# Altium footprint library 9-Pcblib_Con.PcbLib: 266 footprints (part 6 of 17)
Each footprint in its own frame and in the unit in brackets; x right, y up, seen from the top. Pads: shape width x height; smd on the part's side, far side on the other; paste and mask are expansions set on the pad; w line width, h text height; cw(c..) or ccw(c..) is an arc to the next point about the centre after c.
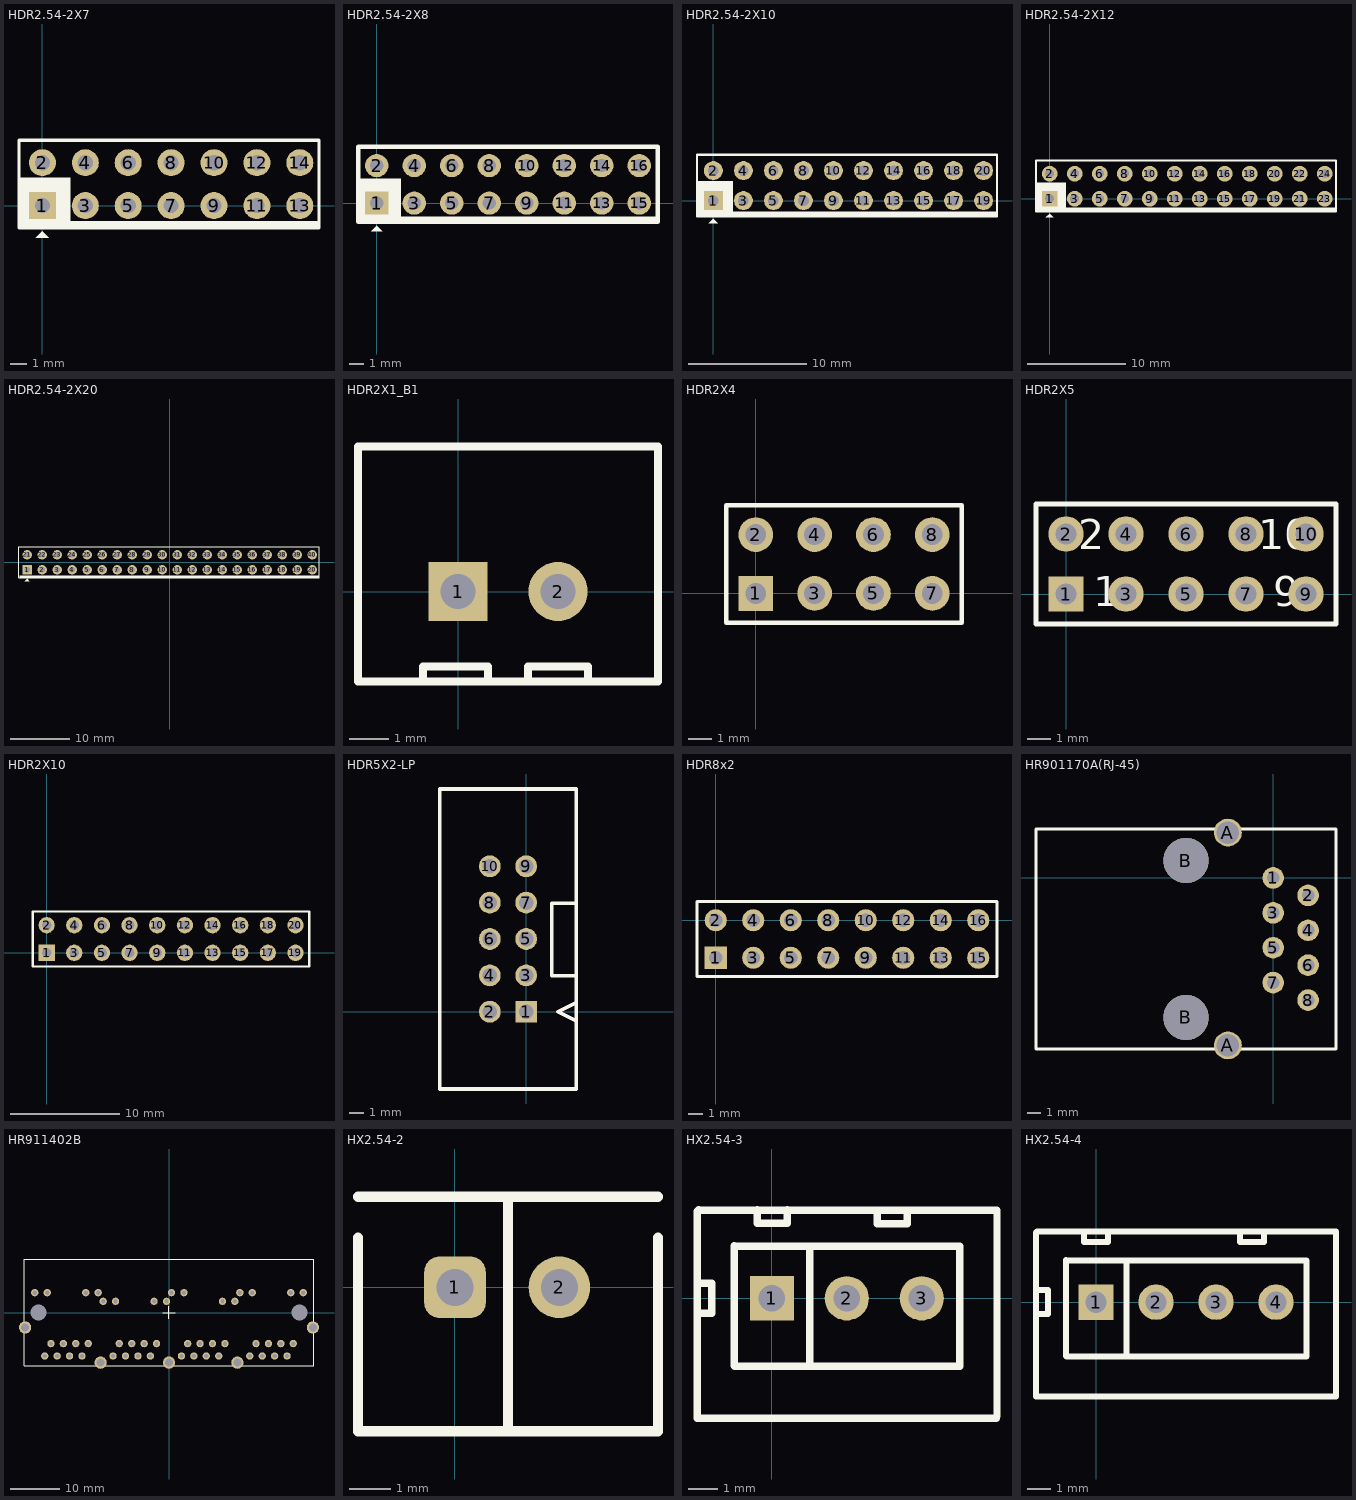
[diagram p5: the footprints below, top view; thin cyan lines are the x and y axes]

## HDR2.54-2X7 [mm]
pads (14):
  rect 1.6x1.6 hole 0.9: 1(0,0)
  round 1.6 hole 0.9: 2(0,2.54) 3(2.54,0) 4(2.54,2.54) 5(5.08,0) 6(5.08,2.54) 7(7.62,0) 8(7.62,2.54) 9(10.16,0) 10(10.16,2.54) 11(12.7,0) 12(12.7,2.54) 13(15.24,0) 14(15.24,2.54)
Top Overlay:
  rectangle: -1.387,-1.328 1.651,1.651
  region: -0.381,-1.905 0.381,-1.905 0,-1.524
  lines w0.2: -1.387,-1.143 16.377,-1.143 ; -1.26,-1.016 16.377,-1.016
  lines w0.203: -1.387,-1.328 -1.387,3.868 16.377,3.868 16.377,-1.328 -1.387,-1.328

## HDR2.54-2X8 [mil]
pads (16):
  rect 62x62 hole 35.43: 1(0,0)
  round 62 hole 35.43: 2(0,100) 3(100,0) 4(100,100) 5(200,0) 6(200,100) 7(300,0) 8(300,100) 9(400,0) 10(400,100) 11(500,0) 12(500,100) 13(600,0) 14(600,100) 15(700,0) 16(700,100)
Top Overlay:
  rectangle: -50,-50 65,65
  region: -15,-75 15,-75 0,-60
  lines w7.87: -50,-40 750,-40
  lines w12: -50,50 50,50 50,-50 ; -50,-50 -50,150 750,150 750,-50 -50,-50

## HDR2.54-2X10 [mm]
pads (20):
  rect 1.6x1.6 hole 0.9: 1(0,0)
  round 1.6 hole 0.9: 2(0,2.54) 3(2.54,0) 4(2.54,2.54) 5(5.08,0) 6(5.08,2.54) 7(7.62,0) 8(7.62,2.54) 9(10.16,0) 10(10.16,2.54) 11(12.7,0) 12(12.7,2.54) 13(15.24,0) 14(15.24,2.54) 15(17.78,0) 16(17.78,2.54) 17(20.32,0) 18(20.32,2.54) 19(22.86,0) 20(22.86,2.54)
Top Overlay:
  rectangle: -1.387,-1.328 1.651,1.651
  region: -0.381,-1.905 0.381,-1.905 0,-1.524
  lines w0.2: -1.26,-1.143 23.997,-1.143 ; -1.26,-1.016 23.997,-1.016
  lines w0.203: -1.387,-1.328 23.997,-1.328 23.997,3.868 -1.387,3.868 -1.387,-1.328

## HDR2.54-2X12 [mm]
pads (24):
  rect 1.6x1.6 hole 0.9: 1(0,0)
  round 1.6 hole 0.9: 2(0,2.54) 3(2.54,0) 4(2.54,2.54) 5(5.08,0) 6(5.08,2.54) 7(7.62,0) 8(7.62,2.54) 9(10.16,0) 10(10.16,2.54) 11(12.7,0) 12(12.7,2.54) 13(15.24,0) 14(15.24,2.54) 15(17.78,0) 16(17.78,2.54) 17(20.32,0) 18(20.32,2.54) 19(22.86,0) 20(22.86,2.54) 21(25.4,0) 22(25.4,2.54) 23(27.94,0) 24(27.94,2.54)
Top Overlay:
  rectangle: -1.387,-1.328 1.651,1.651
  region: -0.381,-1.905 0.381,-1.905 0,-1.524
  lines w0.2: -1.26,-1.143 29.077,-1.143 ; -1.26,-1.016 29.077,-1.016
  lines w0.203: -1.387,-1.328 29.077,-1.328 29.077,3.868 -1.387,3.868 -1.387,-1.328

## HDR2.54-2X20 [mm]
pads (40):
  rect 1.6x1.6 hole 0.9: 1(-24.13,-1.27)
  round 1.6 hole 0.9: 2(-21.59,-1.27) 3(-19.05,-1.27) 4(-16.51,-1.27) 5(-13.97,-1.27) 6(-11.43,-1.27) 7(-8.89,-1.27) 8(-6.35,-1.27) 9(-3.81,-1.27) 10(-1.27,-1.27) 11(1.27,-1.27) 12(3.81,-1.27) 13(6.35,-1.27) 14(8.89,-1.27) 15(11.43,-1.27) 16(13.97,-1.27) 17(16.51,-1.27) 18(19.05,-1.27) 19(21.59,-1.27) 20(24.13,-1.27) 21(-24.13,1.27) 22(-21.59,1.27) 23(-19.05,1.27) 24(-16.51,1.27) 25(-13.97,1.27) 26(-11.43,1.27) 27(-8.89,1.27) 28(-6.35,1.27) 29(-3.81,1.27) 30(-1.27,1.27) 31(1.27,1.27) 32(3.81,1.27) 33(6.35,1.27) 34(8.89,1.27) 35(11.43,1.27) 36(13.97,1.27) 37(16.51,1.27) 38(19.05,1.27) 39(21.59,1.27) 40(24.13,1.27)
Top Overlay:
  region: -24.511,-3.175 -23.749,-3.175 -24.13,-2.794
  lines w0.2: -25.39,-2.413 25.267,-2.413 ; -25.39,-2.286 25.267,-2.286
  lines w0.203: -25.517,-2.598 25.267,-2.598 25.267,2.598 -25.517,2.598 -25.517,-2.598

## HDR2X1_B1 [mm] "Connector; Header; 4 Position"
height 1.6
pads (2):
  rect 1.5x1.5 hole 0.9: 1(0,0)
  round 1.5 hole 0.9: 2(2.54,0)
Top Overlay:
  lines w0.2: -0.889,-2.286 -0.889,-1.905 0.762,-1.905 0.762,-2.286 ; 1.778,-2.286 1.778,-1.905 3.302,-1.905 3.302,-2.286 ; -2.54,-2.286 -2.54,3.683 5.08,3.683 5.08,-2.286 -2.54,-2.286
3D body: height 1.5, standoff 0, extent -2.413,-2.159 5.08,3.556

## HDR2X4 [mm] "Connector; Header; 4x2 Position"
height 10.16
pads (8):
  rect 1.5x1.5 hole 0.9: 1(0,0)
  round 1.5 hole 0.9: 2(0,2.54) 3(2.54,0) 4(2.54,2.54) 5(5.08,0) 6(5.08,2.54) 7(7.62,0) 8(7.62,2.54)
Top Overlay:
  lines w0.2: -1.27,-1.27 8.89,-1.27 8.89,3.81 -1.27,3.81 -1.27,-1.27

## HDR2X5 [mm] "Connector; Header; 5x2 Position"
pads (10):
  rect 1.5x1.5 hole 0.9: 1(0,0)
  round 1.5 hole 0.9: 2(0,2.54) 3(2.54,0) 4(2.54,2.54) 5(5.08,0) 6(5.08,2.54) 7(7.62,0) 8(7.62,2.54) 9(10.16,0) 10(10.16,2.54)
Top Overlay:
  lines w0.2: -1.27,-1.27 11.43,-1.27 11.43,3.81 -1.27,3.81 -1.27,-1.27
  text "10" at 8.128,1.905 h1.27
  text "9" at 8.763,-0.508 h1.27
  text "1" at 1.143,-0.508 h1.27
  text "2" at 0.508,1.905 h1.27

## HDR2X10 [mm] "Connector; Header; 10x2 Position"
height 1.1
pads (20):
  rect 1.5x1.5 hole 0.9: 1(0,0)
  round 1.5 hole 0.9: 2(0,2.54) 3(2.54,0) 4(2.54,2.54) 5(5.08,0) 6(5.08,2.54) 7(7.62,0) 8(7.62,2.54) 9(10.16,0) 10(10.16,2.54) 11(12.7,0) 12(12.7,2.54) 13(15.24,0) 14(15.24,2.54) 15(17.78,0) 16(17.78,2.54) 17(20.32,0) 18(20.32,2.54) 19(22.86,0) 20(22.86,2.54)
Top Overlay:
  lines w0.2: -1.27,-1.27 -1.27,3.81 0.635,3.81 24.13,3.81 24.13,-1.27 0.635,-1.27 -1.27,-1.27

## HDR5X2-LP [mil]
pads (10):
  rect 60x60 hole 40: 1(0,0)
  round 60 hole 40: 2(-100,0) 3(0,100) 4(-100,100) 5(0,200) 6(-100,200) 7(0,300) 8(-100,300) 9(0,400) 10(-100,400)
Top Overlay:
  lines w10: 137.5,-25 87.5,0 137.5,25 ; 137.5,99.37 70.04,99.37 70.04,298.7 137.5,298.7 ; -237.5,-212.5 137.5,-212.5 137.5,612.5 -237.5,612.5 -237.5,-212.5

## HDR8x2 [mm]
pads (16):
  rect 1.5x1.5 hole 0.9: 1(0,-2.54)
  round 1.5 hole 0.9: 2(0,0) 3(2.54,-2.54) 4(2.54,0) 5(5.08,-2.54) 6(5.08,0) 7(7.62,-2.54) 8(7.62,0) 11(12.7,-2.54) 12(12.7,0)
  round 1.5 hole 0.9 mask+0.102: 9(10.16,-2.54) 10(10.16,0) 13(15.24,-2.54) 14(15.24,0) 15(17.78,-2.54) 16(17.78,0)
Top Overlay:
  lines w0.2: -1.27,-3.81 -1.27,1.27 19.05,1.27 19.05,-3.81 -1.27,-3.81
3D body: height 0.7, standoff -10.9, extent -1.27,-1.27 19.05,1.27
3D body: height 0.7, standoff -10.9, extent -1.27,-3.81 19.05,-1.27

## HR901170A(RJ-45) [mil]
pads (12):
  round 62 hole 36: 1(0,0) 2(100,-50) 3(0,-100) 4(100,-150) 5(0,-200) 6(100,-250) 7(0,-300) 8(100,-350)
  round 80 hole 65: A(-130,-480) A(-130,130)
  round 130 hole 130: B(-250,-400) B(-250,50)
Top Overlay:
  lines w8: -680,-490 180,-490 180,140 -680,140 -680,-490

## HR911402B [mm]
pads (55):
  round 1.5 hole 0.89: A1(25.397,-6.262) A2(24.127,-8.802) A3(22.857,-6.262) A4(21.587,-8.802) A5(20.317,-6.262) A6(19.047,-8.802) A7(17.777,-6.262) A8(16.507,-8.802) A9(27.427,4.148) A10(24.887,4.148) A11(17.017,4.148) A12(14.477,4.148) B1(11.427,-6.262) B2(10.157,-8.802) B3(8.887,-6.262) B4(7.617,-8.802) B5(6.347,-6.262) B6(5.077,-8.802) B7(3.807,-6.262) B8(2.537,-8.802) B9(13.457,2.378) B10(10.917,2.378) B11(3.047,4.148) B12(0.507,4.148) C1(-2.543,-6.262) C2(-3.813,-8.802) C3(-5.083,-6.262) C4(-6.353,-8.802) C5(-7.623,-6.262) C6(-8.893,-8.802) C7(-10.163,-6.262) C8(-11.433,-8.802) C9(-0.513,2.378) C10(-3.053,2.378) C11(-10.923,2.378) C12(-13.463,2.378) D1(-16.513,-6.262) D2(-17.783,-8.802) D3(-19.053,-6.262) D4(-20.323,-8.802) D5(-21.593,-6.262) D6(-22.863,-8.802) D7(-24.133,-6.262) D8(-25.403,-8.802) D9(-14.483,4.148) D10(-17.023,4.148) D11(-24.893,4.148) D12(-27.433,4.148)
  round 2.5 hole 1.63: ""(-29.408,-2.962) ""(-13.973,-10.152) ""(-0.003,-10.152) ""(13.967,-10.152) ""(29.402,-2.962)
  round 3 hole 3.25: ""(-26.673,0.088) ""(26.667,0.088)
Top Overlay:
  lines w0.254: -1.273,0.088 1.267,0.088 ; -0.003,-1.182 -0.003,1.358 ; -29.568,-10.802 29.562,-10.802 29.562,10.978 -29.568,10.978 -29.568,-10.802

## HX2.54-2 [mm] "两针白色插座（已加焊）"
pads (2):
  rrect50% 1.5x1.5 hole 0.9: 1(0,0)
  round 1.5 hole 0.9: 2(2.54,0)
Top Overlay:
  lines w0.254: -2.36,1.206 -2.36,-3.5 4.94,-3.5 4.94,1.206 ; -2.36,2.2 4.94,2.2 ; 1.29,-3.5 1.29,2.2
3D body: height 7, standoff -3, extent -2.48,-3.55 5.02,2.45

## HX2.54-3 [mm]
pads (3):
  rect 1.5x1.5 hole 0.9: 1(0,0)
  round 1.5 hole 0.9: 2(2.54,0) 3(5.08,0)
Top Overlay:
  lines w0.254: -2.54,-0.508 -2.032,-0.508 -2.032,0.508 -2.54,0.508 ; -2.536,2.54 -2.536,2.95 ; -2.496,2.995 7.633,2.995 7.633,-4.005 ; -1.27,-2.286 -1.27,1.778 ; -1.257,-2.296 6.363,-2.296 ; -1.257,1.768 6.375,1.768 ; -0.504,2.998 -0.504,2.538 0.512,2.538 0.512,2.998 ; 1.283,-2.296 1.283,1.768 ; 3.573,2.995 3.573,2.535 4.589,2.535 4.589,2.995 ; 6.375,-2.299 6.375,1.765 ; 7.607,-4.061 -2.536,-4.061 -2.536,2.95 ; -2.536,2.95 -2.488,2.998 -2.536,2.95
3D body: height 7, standoff -3, extent -2.409,-3.581 7.591,2.419

## HX2.54-4 [mm]
pads (4):
  rect 1.5x1.5 hole 0.9: 1(0,0)
  round 1.5 hole 0.9: 2(2.54,0) 3(5.08,0) 4(7.62,0)
Top Overlay:
  lines w0.254: -2.54,-0.508 -2.032,-0.508 -2.032,0.508 -2.54,0.508 ; -2.536,-4.002 -2.536,2.95 ; -2.472,-4.002 -2.092,-4.002 10.16,-4.002 10.16,2.998 -2.488,2.998 ; -1.27,-2.286 -1.27,1.778 ; -1.257,-2.296 8.903,-2.296 8.903,1.768 -1.257,1.768 ; -0.504,2.998 -0.504,2.538 0.512,2.538 0.512,2.998 ; 1.283,-2.296 1.283,1.768 ; 6.1,2.998 6.1,2.538 7.116,2.538 7.116,2.998 ; -2.536,2.95 -2.488,2.998 ; -2.536,2.95 -2.488,2.998
3D body: height 7, standoff -3, extent -2.399,-3.562 10.121,2.438